# Altium footprint library cool_library.PcbLib: 1182 footprints (part 19 of 75)
Each footprint in its own frame and in the unit in brackets; x right, y up, seen from the top. Pads: shape width x height; smd on the part's side, far side on the other; paste and mask are expansions set on the pad; w line width, h text height; cw(c..) or ccw(c..) is an arc to the next point about the centre after c.
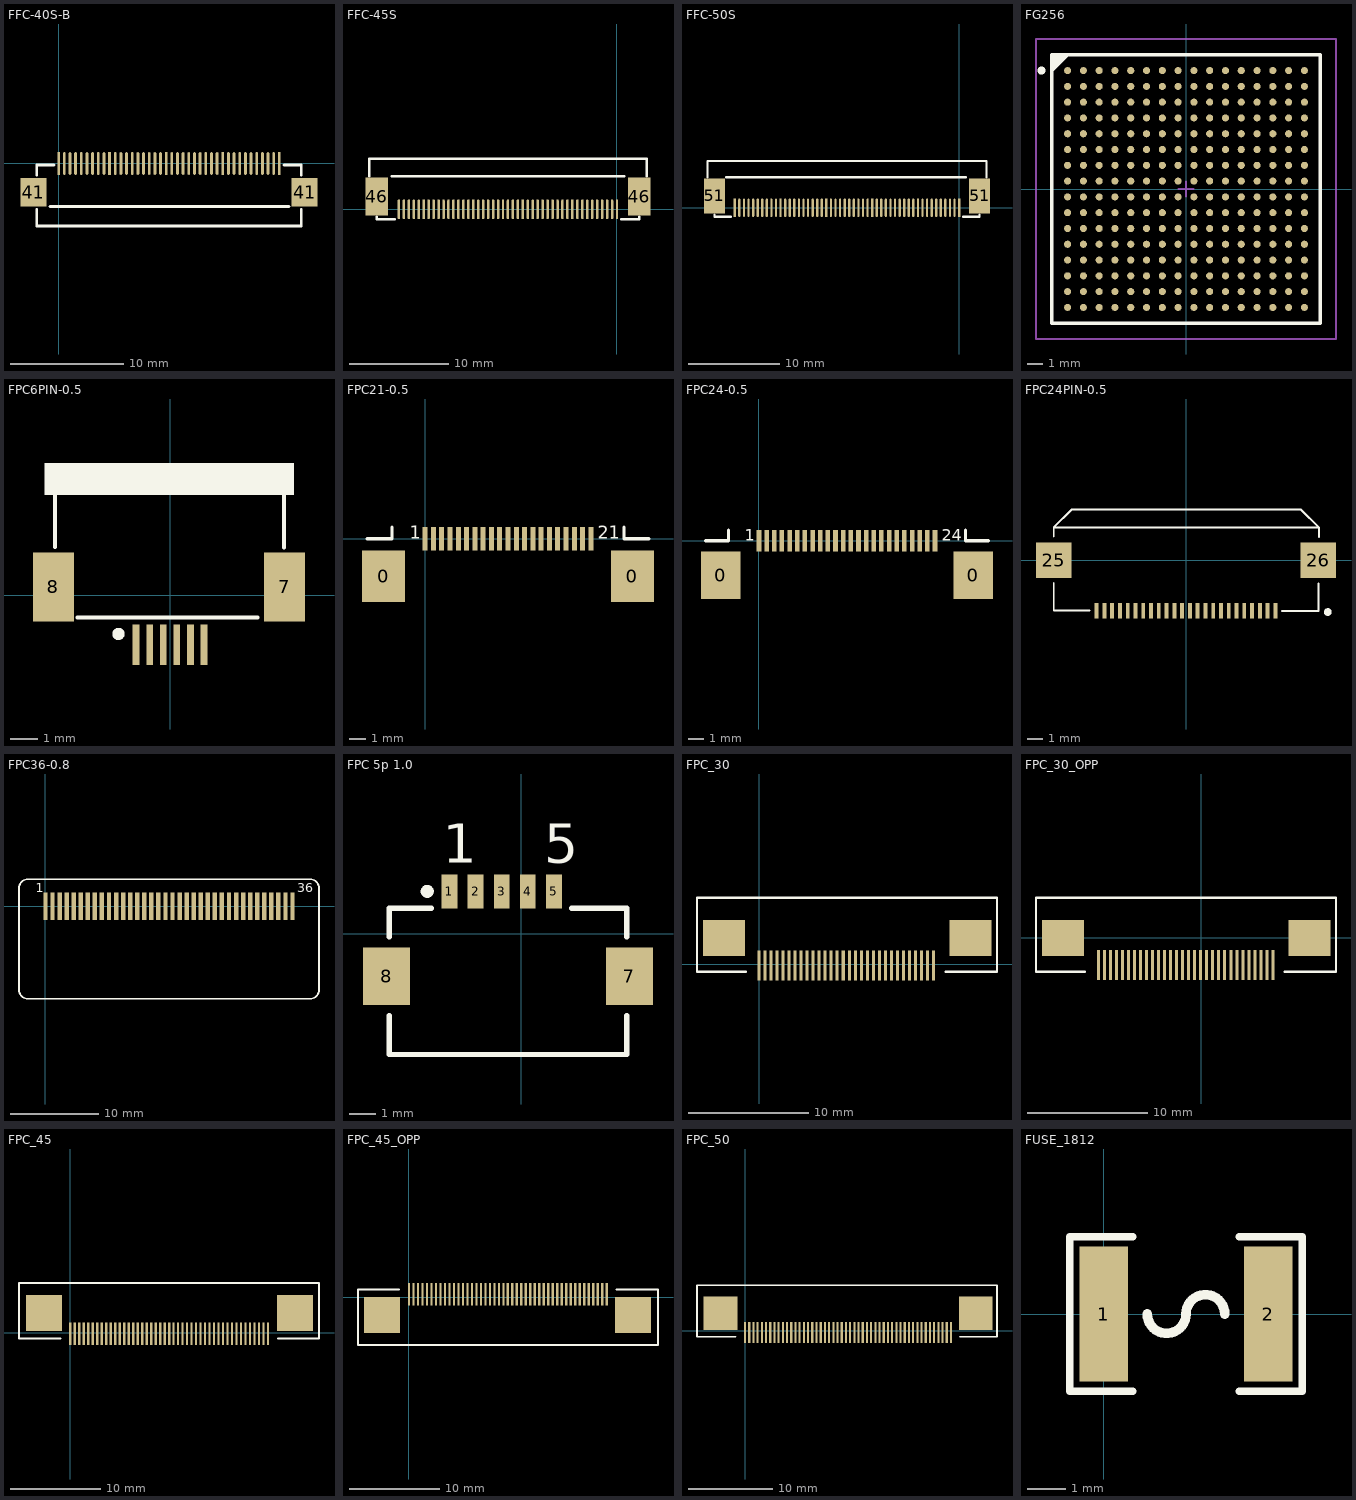
[diagram p18: the footprints below, top view; thin cyan lines are the x and y axes]

## FFC-40S-B [mm]
height 1.6
pads (42):
  rect 0.25x2 smd: 1(0,0) 10(4.5,0) 20(9.5,0) 30(14.5,0) 40(19.5,0)
  oval 0.25x2 smd: 2(0.5,0) 3(1,0) 4(1.5,0) 5(2,0) 6(2.5,0) 7(3,0) 8(3.5,0) 9(4,0) 11(5,0) 12(5.5,0) 13(6,0) 14(6.5,0) 15(7,0) 16(7.5,0) 17(8,0) 18(8.5,0) 19(9,0) 21(10,0) 22(10.5,0) 23(11,0) 24(11.5,0) 25(12,0) 26(12.5,0) 27(13,0) 28(13.5,0) 29(14,0) 31(15,0) 32(15.5,0) 33(16,0) 34(16.5,0) 35(17,0) 36(17.5,0) 37(18,0) 38(18.5,0) 39(19,0)
  rect 2.286x2.54 smd: 41(-2.235,-2.54) 41(21.735,-2.54)
Top Overlay:
  lines w0.254: -1.934,-4.064 -1.934,-5.508 21.434,-5.508 21.434,-4.064 ; -1.934,-1.016 -1.934,-0.133 -0.404,-0.133 ; -0.75,-3.814 20.35,-3.814 ; 19.904,-0.133 21.434,-0.133 21.434,-1.016

## FFC-45S [mm]
pads (47):
  rect 0.25x2 smd: 1(0,0) 10(-4.5,0) 20(-9.5,0) 30(-14.5,0) 40(-19.5,0)
  oval 0.25x2 smd: 2(-0.5,0) 3(-1,0) 4(-1.5,0) 5(-2,0) 6(-2.5,0) 7(-3,0) 8(-3.5,0) 9(-4,0) 11(-5,0) 12(-5.5,0) 13(-6,0) 14(-6.5,0) 15(-7,0) 16(-7.5,0) 17(-8,0) 18(-8.5,0) 19(-9,0) 21(-10,0) 22(-10.5,0) 23(-11,0) 24(-11.5,0) 25(-12,0) 26(-12.5,0) 27(-13,0) 28(-13.5,0) 29(-14,0) 31(-15,0) 32(-15.5,0) 33(-16,0) 34(-16.5,0) 35(-17,0) 36(-17.5,0) 37(-18,0) 38(-18.5,0) 39(-19,0) 41(-20,0) 42(-20.5,0) 43(-21,0) 44(-21.5,0) 45(-22,0)
  rect 2.286x3.81 smd: 46(-24.224,1.29) 46(2.232,1.29)
Top Overlay:
  lines w0.254: -24.986,3.322 -24.986,5.1 2.994,5.1 2.994,3.322 ; -24.224,-0.742 -24.224,-0.996 -22.446,-0.996 ; -22.708,3.322 0.708,3.322 ; 0.454,-0.996 2.232,-0.996 2.232,-0.742

## FFC-50S [mm]
pads (52):
  rect 0.25x2 smd: 1(0,0) 10(-4.5,0) 20(-9.5,0) 30(-14.5,0) 40(-19.5,0) 50(-24.5,0)
  oval 0.25x2 smd: 2(-0.5,0) 3(-1,0) 4(-1.5,0) 5(-2,0) 6(-2.5,0) 7(-3,0) 8(-3.5,0) 9(-4,0) 11(-5,0) 12(-5.5,0) 13(-6,0) 14(-6.5,0) 15(-7,0) 16(-7.5,0) 17(-8,0) 18(-8.5,0) 19(-9,0) 21(-10,0) 22(-10.5,0) 23(-11,0) 24(-11.5,0) 25(-12,0) 26(-12.5,0) 27(-13,0) 28(-13.5,0) 29(-14,0) 31(-15,0) 32(-15.5,0) 33(-16,0) 34(-16.5,0) 35(-17,0) 36(-17.5,0) 37(-18,0) 38(-18.5,0) 39(-19,0) 41(-20,0) 42(-20.5,0) 43(-21,0) 44(-21.5,0) 45(-22,0) 46(-22.5,0) 47(-23,0) 48(-23.5,0) 49(-24,0)
  rect 2.286x3.81 smd: 51(-26.724,1.29) 51(2.232,1.29)
Top Overlay:
  lines w0.254: -27.486,3.322 -27.486,5.1 2.994,5.1 2.994,3.322 ; -26.724,-0.742 -26.724,-0.996 -24.946,-0.996 ; -25.454,3.322 0.708,3.322 ; 0.454,-0.996 2.232,-0.996 2.232,-0.742

## FG256 [mm] "BGA, 256-Leads, Body 17x17mm, Pitch 1mm"
height 1.97
pads (256):
  round 0.45 smd: A1(-7.5,7.5) A2(-6.5,7.5) A3(-5.5,7.5) A4(-4.5,7.5) A5(-3.5,7.5) A6(-2.5,7.5) A7(-1.5,7.5) A8(-0.5,7.5) A9(0.5,7.5) A10(1.5,7.5) A11(2.5,7.5) A12(3.5,7.5) A13(4.5,7.5) A14(5.5,7.5) A15(6.5,7.5) A16(7.5,7.5) B1(-7.5,6.5) B2(-6.5,6.5) B3(-5.5,6.5) B4(-4.5,6.5) B5(-3.5,6.5) B6(-2.5,6.5) B7(-1.5,6.5) B8(-0.5,6.5) B9(0.5,6.5) B10(1.5,6.5) B11(2.5,6.5) B12(3.5,6.5) B13(4.5,6.5) B14(5.5,6.5) B15(6.5,6.5) B16(7.5,6.5) C1(-7.5,5.5) C2(-6.5,5.5) C3(-5.5,5.5) C4(-4.5,5.5) C5(-3.5,5.5) C6(-2.5,5.5) C7(-1.5,5.5) C8(-0.5,5.5) C9(0.5,5.5) C10(1.5,5.5) C11(2.5,5.5) C12(3.5,5.5) C13(4.5,5.5) C14(5.5,5.5) C15(6.5,5.5) C16(7.5,5.5) D1(-7.5,4.5) D2(-6.5,4.5) D3(-5.5,4.5) D4(-4.5,4.5) D5(-3.5,4.5) D6(-2.5,4.5) D7(-1.5,4.5) D8(-0.5,4.5) D9(0.5,4.5) D10(1.5,4.5) D11(2.5,4.5) D12(3.5,4.5) D13(4.5,4.5) D14(5.5,4.5) D15(6.5,4.5) D16(7.5,4.5) E1(-7.5,3.5) E2(-6.5,3.5) E3(-5.5,3.5) E4(-4.5,3.5) E5(-3.5,3.5) E6(-2.5,3.5) E7(-1.5,3.5) E8(-0.5,3.5) E9(0.5,3.5) E10(1.5,3.5) E11(2.5,3.5) E12(3.5,3.5) E13(4.5,3.5) E14(5.5,3.5) E15(6.5,3.5) E16(7.5,3.5) F1(-7.5,2.5) F2(-6.5,2.5) F3(-5.5,2.5) F4(-4.5,2.5) F5(-3.5,2.5) F6(-2.5,2.5) F7(-1.5,2.5) F8(-0.5,2.5) F9(0.5,2.5) F10(1.5,2.5) F11(2.5,2.5) F12(3.5,2.5) F13(4.5,2.5) F14(5.5,2.5) F15(6.5,2.5) F16(7.5,2.5) G1(-7.5,1.5) G2(-6.5,1.5) G3(-5.5,1.5) G4(-4.5,1.5) G5(-3.5,1.5) G6(-2.5,1.5) G7(-1.5,1.5) G8(-0.5,1.5) G9(0.5,1.5) G10(1.5,1.5) G11(2.5,1.5) G12(3.5,1.5) G13(4.5,1.5) G14(5.5,1.5) G15(6.5,1.5) G16(7.5,1.5) H1(-7.5,0.5) H2(-6.5,0.5) H3(-5.5,0.5) H4(-4.5,0.5) H5(-3.5,0.5) H6(-2.5,0.5) H7(-1.5,0.5) H8(-0.5,0.5) H9(0.5,0.5) H10(1.5,0.5) H11(2.5,0.5) H12(3.5,0.5) H13(4.5,0.5) H14(5.5,0.5) H15(6.5,0.5) H16(7.5,0.5) J1(-7.5,-0.5) J2(-6.5,-0.5) J3(-5.5,-0.5) J4(-4.5,-0.5) J5(-3.5,-0.5) J6(-2.5,-0.5) J7(-1.5,-0.5) J8(-0.5,-0.5) J9(0.5,-0.5) J10(1.5,-0.5) J11(2.5,-0.5) J12(3.5,-0.5) J13(4.5,-0.5) J14(5.5,-0.5) J15(6.5,-0.5) J16(7.5,-0.5) K1(-7.5,-1.5) K2(-6.5,-1.5) K3(-5.5,-1.5) K4(-4.5,-1.5) K5(-3.5,-1.5) K6(-2.5,-1.5) K7(-1.5,-1.5) K8(-0.5,-1.5) K9(0.5,-1.5) K10(1.5,-1.5) K11(2.5,-1.5) K12(3.5,-1.5) K13(4.5,-1.5) K14(5.5,-1.5) K15(6.5,-1.5) K16(7.5,-1.5) L1(-7.5,-2.5) L2(-6.5,-2.5) L3(-5.5,-2.5) L4(-4.5,-2.5) L5(-3.5,-2.5) L6(-2.5,-2.5) L7(-1.5,-2.5) L8(-0.5,-2.5) L9(0.5,-2.5) L10(1.5,-2.5) L11(2.5,-2.5) L12(3.5,-2.5) L13(4.5,-2.5) L14(5.5,-2.5) L15(6.5,-2.5) L16(7.5,-2.5) M1(-7.5,-3.5) M2(-6.5,-3.5) M3(-5.5,-3.5) M4(-4.5,-3.5) M5(-3.5,-3.5) M6(-2.5,-3.5) M7(-1.5,-3.5) M8(-0.5,-3.5) M9(0.5,-3.5) M10(1.5,-3.5) M11(2.5,-3.5) M12(3.5,-3.5) M13(4.5,-3.5) M14(5.5,-3.5) M15(6.5,-3.5) M16(7.5,-3.5) N1(-7.5,-4.5) N2(-6.5,-4.5) N3(-5.5,-4.5) N4(-4.5,-4.5) N5(-3.5,-4.5) N6(-2.5,-4.5) N7(-1.5,-4.5) N8(-0.5,-4.5) N9(0.5,-4.5) N10(1.5,-4.5) N11(2.5,-4.5) N12(3.5,-4.5) N13(4.5,-4.5) N14(5.5,-4.5) N15(6.5,-4.5) N16(7.5,-4.5) P1(-7.5,-5.5) P2(-6.5,-5.5) P3(-5.5,-5.5) P4(-4.5,-5.5) P5(-3.5,-5.5) P6(-2.5,-5.5) P7(-1.5,-5.5) P8(-0.5,-5.5) P9(0.5,-5.5) P10(1.5,-5.5) P11(2.5,-5.5) P12(3.5,-5.5) P13(4.5,-5.5) P14(5.5,-5.5) P15(6.5,-5.5) P16(7.5,-5.5) R1(-7.5,-6.5) R2(-6.5,-6.5) R3(-5.5,-6.5) R4(-4.5,-6.5) R5(-3.5,-6.5) R6(-2.5,-6.5) R7(-1.5,-6.5) R8(-0.5,-6.5) R9(0.5,-6.5) R10(1.5,-6.5) R11(2.5,-6.5) R12(3.5,-6.5) R13(4.5,-6.5) R14(5.5,-6.5) R15(6.5,-6.5) R16(7.5,-6.5) T1(-7.5,-7.5) T2(-6.5,-7.5) T3(-5.5,-7.5) T4(-4.5,-7.5) T5(-3.5,-7.5) T6(-2.5,-7.5) T7(-1.5,-7.5) T8(-0.5,-7.5) T9(0.5,-7.5) T10(1.5,-7.5) T11(2.5,-7.5) T12(3.5,-7.5) T13(4.5,-7.5) T14(5.5,-7.5) T15(6.5,-7.5) T16(7.5,-7.5)
Top Overlay:
  circle w0.25: c-9.15,7.5 r0.125
  region: -7.5,8.5 -8.5,7.5 -8.5,8.5
  lines w0.2: -8.5,7.5 -7.5,8.5 ; -8.5,-8.5 8.5,-8.5 8.5,8.5 -8.5,8.5 -8.5,-8.5
Mechanical 13:
  lines w0.1: -8.5,-8.5 8.5,-8.5 8.5,8.5 -8.5,8.5 -8.5,-8.5
Mechanical 15:
  lines w0.1: -0.5,0 0.5,0 ; 0,-0.5 0,0.5 ; -9.5,-9.5 9.5,-9.5 9.5,9.5 -9.5,9.5 -9.5,-9.5
3D body: height 1.97, standoff 0, extent -8.5,-8.5 8.5,8.5

## FPC6PIN-0.5 [mm]
pads (8):
  rect 0.25x1.5 smd: 1(-1.25,-1.825) 2(-0.75,-1.825) 3(-0.25,-1.825) 4(0.25,-1.825) 5(0.75,-1.825) 6(1.25,-1.825)
  rect 1.524x2.54 smd: 7(4.216,0.305) 8(-4.293,0.305)
Top Overlay:
  circle w0.254: c-1.9,-1.425 r0.1
  region: 3,4.775 3,4.775 3,4.425 3,4.425
  region: 4.572,4.877 -4.623,4.877 -4.623,3.683 4.572,3.683
  lines w0.15: -4.242,1.778 -4.242,4.775 3.835,4.775 ; -3.404,-0.825 3,-0.825 ; 2.6,-0.825 3.226,-0.825 ; 4.191,1.753 4.191,4.724
3D body: height 2.12, standoff -0.19, extent -4.603,-1.973 4.552,4.674

## FPC21-0.5 [mm]
pads (23):
  rect 2.6x3.1 smd: 0(-2.5,-2.25) 0(12.5,-2.25)
  rect 0.3x1.4 smd: 1(0,0) 2(0.5,0) 3(1,0) 4(1.5,0) 5(2,0) 6(2.5,0) 7(3,0) 8(3.5,0) 9(4,0) 10(4.5,0) 11(5,0) 12(5.5,0) 13(6,0) 14(6.5,0) 15(7,0) 16(7.5,0) 17(8,0) 18(8.5,0) 19(9,0) 20(9.5,0) 21(10,0)
Top Overlay:
  lines w0.203: -3.5,0 -2,0 -2,0.7 ; 12,0.7 12,0 13.5,0
  text "1" at -0.914,0 h0.76
  text "21" at 10.414,0 h0.76

## FPC24-0.5 [mm]
pads (26):
  rect 2.6x3.1 smd: 0(-2.5,-2.25) 0(14,-2.25)
  rect 0.3x1.4 smd: 1(0,0) 2(0.5,0) 3(1,0) 4(1.5,0) 5(2,0) 6(2.5,0) 7(3,0) 8(3.5,0) 9(4,0) 10(4.5,0) 11(5,0) 12(5.5,0) 13(6,0) 14(6.5,0) 15(7,0) 16(7.5,0) 17(8,0) 18(8.5,0) 19(9,0) 20(9.5,0) 21(10,0) 22(10.5,0) 23(11,0) 24(11.5,0)
Top Overlay:
  lines w0.203: -3.5,0 -2,0 -2,0.7 ; 13.5,0.7 13.5,0 15,0
  text "24" at 11.938,0 h0.76
  text "1" at -0.914,0 h0.76

## FPC24PIN-0.5 [mm] "CAMERA ROTARY FPC 24 WAY 0.5 PITCH"
pads (26):
  rect 0.25x1 smd: 1(5.75,-3.25) 2(5.25,-3.25) 3(4.75,-3.25) 4(4.25,-3.25) 5(3.75,-3.25) 6(3.25,-3.25) 7(2.75,-3.25) 8(2.25,-3.25) 9(1.75,-3.25) 10(1.25,-3.25) 11(0.75,-3.25) 12(0.25,-3.25) 13(-0.25,-3.25) 14(-0.75,-3.25) 15(-1.25,-3.25) 16(-1.75,-3.25) 17(-2.25,-3.25) 18(-2.75,-3.25) 19(-3.25,-3.25) 20(-3.75,-3.25) 21(-4.25,-3.25) 22(-4.75,-3.25) 23(-5.25,-3.25) 24(-5.75,-3.25)
  rect 2.286x2.286 smd: 25(-8.509,0) 26(8.509,0)
Top Overlay:
  circle w0.254: c9.123,-3.34 r0.117
  lines w0.127: -8.51,-3.251 -8.51,-1.48 ; -8.51,1.51 -8.51,2.11 ; 8.53,-3.251 8.53,-1.5 ; 8.54,2.11 -8.51,2.11 ; 8.56,1.49 8.56,2.09 7.399,3.251 -7.369,3.251 -8.51,2.11
  lines w0.128: -8.5,-3.24 -6.22,-3.24 ; 6.18,-3.26 8.53,-3.26
3D body: height 2, standoff 0, extent -8.04,-4.56 8.06,1.34
3D body: height 5.85, standoff -0.18, extent -6.17,-0.55 6.33,20.95

## FPC36-0.8 [mm]
pads (36):
  rect 0.5x3.1 smd: 1(0,0) 2(0.8,0) 3(1.6,0) 4(2.4,0) 5(3.2,0) 6(4,0) 7(4.8,0) 8(5.6,0) 9(6.4,0) 10(7.2,0) 11(8,0) 12(8.8,0) 13(9.6,0) 14(10.4,0) 15(11.2,0) 16(12,0) 17(12.8,0) 18(13.6,0) 19(14.4,0) 20(15.2,0) 21(16,0) 22(16.8,0) 23(17.6,0) 24(18.4,0) 25(19.2,0) 26(20,0) 27(20.8,0) 28(21.6,0) 29(22.4,0) 30(23.2,0) 31(24,0) 32(24.8,0) 33(25.6,0) 34(26.4,0) 35(27.2,0) 36(28,0)
Top Overlay:
  lines w0.203: -3,-9.5 ccw(c-2,-9.5) -2,-10.5 30,-10.5 ccw(c30,-9.5) 31,-9.5 31,2.05 ccw(c30,2.05) 30,3.05 -2,3.05 ccw(c-2,2.05) -3,2.05 -3,-9.5
  text "1" at -1.092,1.549 h1.02
  text "36" at 28.524,1.575 h1.02

## FPC 5p 1.0 [mm] "Connector; FH12 Series; 6 Position; 1.0mm Spaced Bottom Eccentric Contact"
height 2
pads (7):
  rect 0.6x1.3 smd: 1(-2.75,1.625) 2(-1.75,1.625) 3(-0.75,1.625) 4(0.25,1.625) 5(1.25,1.625)
  rect 1.8x2.2 smd: 7(4.134,-1.625) 8(-5.15,-1.625)
Top Overlay:
  circle w0.25: c-3.6,1.625 r0.125
  lines w0.2: -5.05,-3.125 -5.05,-4.625 4.034,-4.625 4.034,-3.125 ; -5.05,-0.125 -5.05,0.975 -3.45,0.975 ; 1.934,0.975 4.034,0.975 4.034,-0.125
  text "5" at 0.889,2.718 h1.5
  text "1" at -3,2.725 h1.5

## FPC_30 [mm]
pads (32):
  rect 0.25x2.5 smd: 1(-0.017,-0.076) 2(0.483,-0.076) 3(0.983,-0.076) 4(1.483,-0.076) 5(1.983,-0.076) 6(2.483,-0.076) 7(2.983,-0.076) 8(3.483,-0.076) 9(3.983,-0.076) 10(4.483,-0.076) 11(4.983,-0.076) 12(5.483,-0.076) 13(5.983,-0.076) 14(6.483,-0.076) 15(6.983,-0.076) 16(7.483,-0.076) 17(7.983,-0.076) 18(8.483,-0.076) 19(8.983,-0.076) 20(9.483,-0.076) 21(9.983,-0.076) 22(10.483,-0.076) 23(10.983,-0.076) 24(11.483,-0.076) 25(11.983,-0.076) 26(12.483,-0.076) 27(12.983,-0.076) 28(13.483,-0.076) 29(13.983,-0.076) 30(14.483,-0.076)
  rect 3.5x3 smd: ""(-2.938,2.21) ""(17.56,2.21)
Top Overlay:
  lines w0.2: -1.117,-0.601 -5.18,-0.601 -5.18,5.549 19.77,5.549 19.77,-0.601 15.52,-0.601

## FPC_30_OPP [mm]
pads (32):
  rect 0.25x2.5 smd: 1(5.947,-2.284) 2(5.447,-2.284) 3(4.947,-2.284) 4(4.447,-2.284) 5(3.947,-2.284) 6(3.447,-2.284) 7(2.947,-2.284) 8(2.447,-2.284) 9(1.947,-2.284) 10(1.447,-2.284) 11(0.947,-2.284) 12(0.447,-2.284) 13(-0.053,-2.284) 14(-0.553,-2.284) 15(-1.053,-2.284) 16(-1.553,-2.284) 17(-2.053,-2.284) 18(-2.553,-2.284) 19(-3.053,-2.284) 20(-3.553,-2.284) 21(-4.053,-2.284) 22(-4.553,-2.284) 23(-5.053,-2.284) 24(-5.553,-2.284) 25(-6.053,-2.284) 26(-6.553,-2.284) 27(-7.053,-2.284) 28(-7.553,-2.284) 29(-8.053,-2.284) 30(-8.553,-2.284)
  rect 3.5x3 smd: ""(-11.508,-0.02) ""(8.99,-0.02)
Top Overlay:
  lines w0.2: -9.687,-2.831 -13.75,-2.831 -13.75,3.319 11.2,3.319 11.2,-2.831 6.95,-2.831

## FPC_45 [mm]
height 2.1
pads (47):
  rect 0.25x2.5 smd: 1(0.003,-0.086) 2(0.503,-0.086) 3(1.003,-0.086) 4(1.503,-0.086) 5(2.003,-0.086) 6(2.503,-0.086) 7(3.003,-0.086) 8(3.503,-0.086) 9(4.003,-0.086) 10(4.503,-0.086) 11(5.003,-0.086) 12(5.503,-0.086) 13(6.003,-0.086) 14(6.503,-0.086) 15(7.003,-0.086) 16(7.503,-0.086) 17(8.003,-0.086) 18(8.503,-0.086) 19(9.003,-0.086) 20(9.503,-0.086) 21(10.003,-0.086) 22(10.503,-0.086) 23(11.003,-0.086) 24(11.503,-0.086) 25(12.003,-0.086) 26(12.503,-0.086) 27(13.003,-0.086) 28(13.503,-0.086) 29(14.003,-0.086) 30(14.503,-0.086) 31(15.003,-0.086) 32(15.503,-0.086) 33(16.003,-0.086) 34(16.503,-0.086) 35(17.003,-0.086) 36(17.503,-0.086) 37(18.003,-0.086) 38(18.503,-0.086) 39(19.003,-0.086) 40(19.503,-0.086) 41(20.003,-0.086) 42(20.503,-0.086) 43(21.003,-0.086) 44(21.503,-0.086) 45(22.003,-0.086)
  rect 4x4 smd: ""(-2.918,2.2) ""(25.022,2.2)
Top Overlay:
  lines w0.2: -1.097,-0.611 -5.712,-0.611 -5.712,5.539 27.689,5.539 27.689,-0.611 23.103,-0.611

## FPC_45_OPP [mm]
height 2.1
pads (47):
  rect 0.25x2.5 smd: 1(0.016,0.316) 2(0.516,0.316) 3(1.016,0.316) 4(1.516,0.316) 5(2.016,0.316) 6(2.516,0.316) 7(3.016,0.316) 8(3.516,0.316) 9(4.016,0.316) 10(4.516,0.316) 11(5.016,0.316) 12(5.516,0.316) 13(6.016,0.316) 14(6.516,0.316) 15(7.016,0.316) 16(7.516,0.316) 17(8.016,0.316) 18(8.516,0.316) 19(9.016,0.316) 20(9.516,0.316) 21(10.016,0.316) 22(10.516,0.316) 23(11.016,0.316) 24(11.516,0.316) 25(12.016,0.316) 26(12.516,0.316) 27(13.016,0.316) 28(13.516,0.316) 29(14.016,0.316) 30(14.516,0.316) 31(15.016,0.316) 32(15.516,0.316) 33(16.016,0.316) 34(16.516,0.316) 35(17.016,0.316) 36(17.516,0.316) 37(18.016,0.316) 38(18.516,0.316) 39(19.016,0.316) 40(19.516,0.316) 41(20.016,0.316) 42(20.516,0.316) 43(21.016,0.316) 44(21.516,0.316) 45(22.016,0.316)
  rect 4x4 smd: ""(-3.003,-1.97) ""(24.937,-1.97)
Top Overlay:
  lines w0.2: -1.084,0.841 -5.67,0.841 -5.67,-5.309 27.731,-5.309 27.731,0.841 23.116,0.841

## FPC_50 [mm]
pads (52):
  rect 0.25x2.5 smd: 1(-0.004,-0.169) 2(0.496,-0.169) 3(0.996,-0.169) 4(1.496,-0.169) 5(1.996,-0.169) 6(2.496,-0.169) 7(2.996,-0.169) 8(3.496,-0.169) 9(3.996,-0.169) 10(4.496,-0.169) 11(4.996,-0.169) 12(5.496,-0.169) 13(5.996,-0.169) 14(6.496,-0.169) 15(6.996,-0.169) 16(7.496,-0.169) 17(7.996,-0.169) 18(8.496,-0.169) 19(8.996,-0.169) 20(9.496,-0.169) 21(9.996,-0.169) 22(10.496,-0.169) 23(10.996,-0.169) 24(11.496,-0.169) 25(11.996,-0.169) 26(12.496,-0.169) 27(12.996,-0.169) 28(13.496,-0.169) 29(13.996,-0.169) 30(14.496,-0.169) 31(14.996,-0.169) 32(15.496,-0.169) 33(15.996,-0.169) 34(16.496,-0.169) 35(16.996,-0.169) 36(17.496,-0.169) 37(17.996,-0.169) 38(18.496,-0.169) 39(18.996,-0.169) 40(19.496,-0.169) 41(19.996,-0.169) 42(20.496,-0.169) 43(20.996,-0.169) 44(21.496,-0.169) 45(21.996,-0.169) 46(22.496,-0.169) 47(22.996,-0.169) 48(23.496,-0.169) 49(23.996,-0.169) 50(24.496,-0.169)
  rect 4x4 smd: ""(-2.925,2.117) ""(27.428,2.117)
Top Overlay:
  lines w0.2: -1.104,-0.694 -5.719,-0.694 -5.719,5.456 29.968,5.456 29.968,-0.694 25.523,-0.694

## FUSE_1812 [mil]
height 62.99
pads (2):
  rect 50x140 smd: 1(0,0) 2(170,0)
Top Overlay:
  lines w7.87: 30,-80 -35,-80 -35,80 30,80 ; 140,-80 205,-80 205,80 140,80
  lines w10: 45,0 ccw(c65,0) 85,0 cw(c105,0) 125,0